# Altium footprint library General_Lib.PcbLib: 729 footprints (part 3 of 46)
Each footprint in its own frame and in the unit in brackets; x right, y up, seen from the top. Pads: shape width x height; smd on the part's side, far side on the other; paste and mask are expansions set on the pad; w line width, h text height; cw(c..) or ccw(c..) is an arc to the next point about the centre after c.
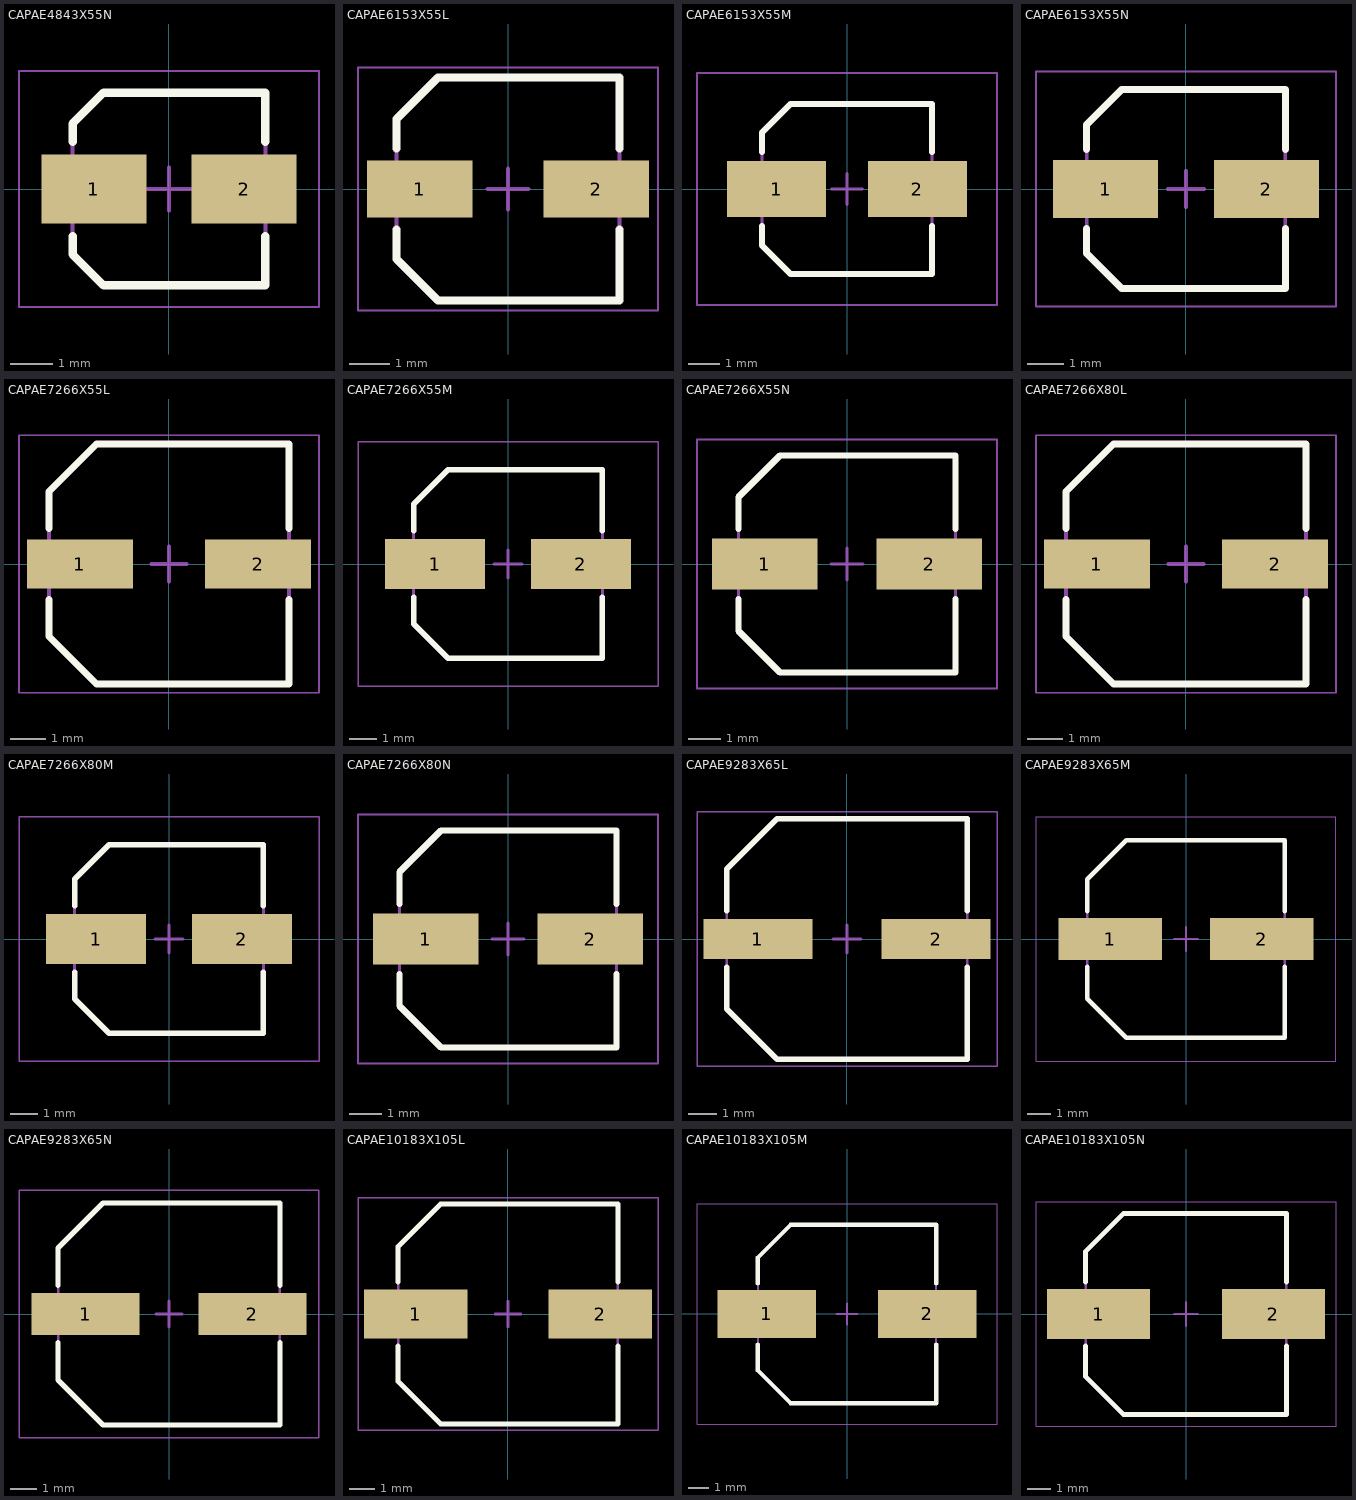
[diagram p2: the footprints below, top view; thin cyan lines are the x and y axes]

## CAPAE4843X55N [mm] "Aluminum Electrolytic Capacitor, Body 4,30x4,30x5,50mm, IPC Medium Density"
height 5.5
pads (2):
  rect 2.45x1.6 smd: 1(-1.75,0) 2(1.75,0)
Top Overlay:
  lines w0.2: -2.25,-1.1 -2.25,-1.525 -1.525,-2.25 2.25,-2.25 2.25,-1.1 ; -2.25,1.1 -2.25,1.525 -1.525,2.25 2.25,2.25 2.25,1.1
Mechanical 13:
  lines w0.1: -2.25,-1.525 -2.25,1.525 -1.525,2.25 2.25,2.25 2.25,-2.25 -1.525,-2.25 -2.25,-1.525
Mechanical 15:
  lines w0.05: -3.5,-2.75 3.5,-2.75 3.5,2.75 -3.5,2.75 -3.5,-2.75
  lines w0.1: -0.5,0 0.5,0 ; 0,-0.5 0,0.5
3D body "CAPAE4843X55N.step": height 5.5, standoff 0, extent -2.375,-2.25 2.375,2.25

## CAPAE6153X55L [mm] "Aluminum Electrolytic Capacitor, Body 5,30x5,30x5,50mm, IPC High Density"
height 5.5
pads (2):
  rect 2.6x1.4 smd: 1(-2.175,0) 2(2.175,0)
Top Overlay:
  lines w0.2: -2.75,-1 -2.75,-1.725 -1.725,-2.75 2.75,-2.75 2.75,-1 ; -2.75,1 -2.75,1.725 -1.725,2.75 2.75,2.75 2.75,1
Mechanical 13:
  lines w0.1: -2.75,-1.725 -2.75,1.725 -1.725,2.75 2.75,2.75 2.75,-2.75 -1.725,-2.75 -2.75,-1.725
Mechanical 15:
  lines w0.05: -3.7,-3 3.7,-3 3.7,3 -3.7,3 -3.7,-3
  lines w0.1: -0.5,0 0.5,0 ; 0,-0.5 0,0.5
3D body "CAPAE6153X55L.step": height 5.5, standoff 0, extent -3.05,-2.75 3.05,2.75

## CAPAE6153X55M [mm] "Aluminum Electrolytic Capacitor, Body 5,30x5,30x5,50mm, IPC Low Density"
height 5.5
pads (2):
  rect 3.2x1.8 smd: 1(-2.275,0) 2(2.275,0)
Top Overlay:
  lines w0.2: -2.75,-1.2 -2.75,-1.825 -1.825,-2.75 2.75,-2.75 2.75,-1.2 ; -2.75,1.2 -2.75,1.825 -1.825,2.75 2.75,2.75 2.75,1.2
Mechanical 13:
  lines w0.1: -2.75,-1.825 -1.825,-2.75 2.75,-2.75 2.75,2.75 -1.825,2.75 -2.75,1.825 -2.75,-1.825
Mechanical 15:
  lines w0.05: -4.85,-3.75 -4.85,3.75 4.85,3.75 4.85,-3.75 -4.85,-3.75
  lines w0.1: -0.5,0 0.5,0 ; 0,-0.5 0,0.5
3D body "CAPAE6153X55M.step": height 5.5, standoff 0, extent -3.05,-2.75 3.05,2.75

## CAPAE6153X55N [mm] "Aluminum Electrolytic Capacitor, Body 5,30x5,30x5,50mm, IPC Medium Density"
height 5.5
pads (2):
  rect 2.9x1.6 smd: 1(-2.225,0) 2(2.225,0)
Top Overlay:
  lines w0.2: -2.75,-1.1 -2.75,-1.775 -1.775,-2.75 2.75,-2.75 2.75,-1.1 ; -2.75,1.1 -2.75,1.775 -1.775,2.75 2.75,2.75 2.75,1.1
Mechanical 13:
  lines w0.1: -2.75,-1.775 -1.775,-2.75 2.75,-2.75 2.75,2.75 -1.775,2.75 -2.75,1.775 -2.75,-1.775
Mechanical 15:
  lines w0.05: -4.15,-3.25 -4.15,3.25 4.15,3.25 4.15,-3.25 -4.15,-3.25
  lines w0.1: -0.5,0 0.5,0 ; 0,-0.5 0,0.5
3D body "CAPAE6153X55N.step": height 5.5, standoff 0, extent -3.05,-2.75 3.05,2.75

## CAPAE7266X55L [mm] "Aluminum Electrolytic Capacitor, Body 6,60x6,60x5,50mm, IPC High Density"
height 5.5
pads (2):
  rect 3x1.4 smd: 1(-2.525,0) 2(2.525,0)
Top Overlay:
  lines w0.2: -3.4,-1 -3.4,-2.05 -2.05,-3.4 3.4,-3.4 3.4,-1 ; -3.4,1 -3.4,2.05 -2.05,3.4 3.4,3.4 3.4,1
Mechanical 13:
  lines w0.1: -3.4,-2.05 -2.05,-3.4 3.4,-3.4 3.4,3.4 -2.05,3.4 -3.4,2.05 -3.4,-2.05
Mechanical 15:
  lines w0.05: -4.25,-3.65 -4.25,3.65 4.25,3.65 4.25,-3.65 -4.25,-3.65
  lines w0.1: -0.5,0 0.5,0 ; 0,-0.5 0,0.5
3D body "CAPAE7266X55L.step": height 5.5, standoff -0.8, extent -3.6,-3.4 3.6,3.4

## CAPAE7266X55M [mm] "Aluminum Electrolytic Capacitor, Body 6,60x6,60x5,50mm, IPC Low Density"
height 5.5
pads (2):
  rect 3.6x1.8 smd: 1(-2.625,0) 2(2.625,0)
Top Overlay:
  lines w0.2: -3.4,-1.2 -3.4,-2.15 -2.15,-3.4 3.4,-3.4 3.4,-1.2 ; -3.4,1.2 -3.4,2.15 -2.15,3.4 3.4,3.4 3.4,1.2
Mechanical 13:
  lines w0.1: -3.4,-2.15 -2.15,-3.4 3.4,-3.4 3.4,3.4 -2.15,3.4 -3.4,2.15 -3.4,-2.15
Mechanical 15:
  lines w0.05: -5.4,-4.4 -5.4,4.4 5.4,4.4 5.4,-4.4 -5.4,-4.4
  lines w0.1: -0.5,0 0.5,0 ; 0,-0.5 0,0.5
3D body "CAPAE7266X55M.step": height 5.5, standoff -0.8, extent -3.6,-3.4 3.6,3.4

## CAPAE7266X55N [mm] "Aluminum Electrolytic Capacitor, Body 6,60x6,60x5,50mm, IPC Medium Density"
height 5.5
pads (2):
  rect 3.3x1.6 smd: 1(-2.575,0) 2(2.575,0)
Top Overlay:
  lines w0.2: -3.4,-1.1 -3.4,-2.1 -2.1,-3.4 3.4,-3.4 3.4,-1.1 ; -3.4,1.1 -3.4,2.1 -2.1,3.4 3.4,3.4 3.4,1.1
Mechanical 13:
  lines w0.1: -3.4,-2.1 -3.4,2.1 -2.1,3.4 3.4,3.4 3.4,-3.4 -2.1,-3.4 -3.4,-2.1
Mechanical 15:
  lines w0.05: -4.7,-3.9 4.7,-3.9 4.7,3.9 -4.7,3.9 -4.7,-3.9
  lines w0.1: -0.5,0 0.5,0 ; 0,-0.5 0,0.5
3D body "CAPAE7266X55N.step": height 5.5, standoff -0.8, extent -3.6,-3.4 3.6,3.4

## CAPAE7266X80L [mm] "Aluminum Electrolytic Capacitor, Body 6,60x6,60x8,00mm, IPC High Density"
height 8
pads (2):
  rect 3x1.4 smd: 1(-2.525,0) 2(2.525,0)
Top Overlay:
  lines w0.2: -3.4,-1 -3.4,-2.05 -2.05,-3.4 3.4,-3.4 3.4,-1 ; -3.4,1 -3.4,2.05 -2.05,3.4 3.4,3.4 3.4,1
Mechanical 13:
  lines w0.1: -3.4,-2.05 -3.4,2.05 -2.05,3.4 3.4,3.4 3.4,-3.4 -2.05,-3.4 -3.4,-2.05
Mechanical 15:
  lines w0.05: -4.25,-3.65 4.25,-3.65 4.25,3.65 -4.25,3.65 -4.25,-3.65
  lines w0.1: -0.5,0 0.5,0 ; 0,-0.5 0,0.5
3D body "CAPAE7266X80L.step": height 8, standoff 0, extent -3.6,-3.4 3.6,3.4

## CAPAE7266X80M [mm] "Aluminum Electrolytic Capacitor, Body 6,60x6,60x8,00mm, IPC Low Density"
height 8
pads (2):
  rect 3.6x1.8 smd: 1(-2.625,0) 2(2.625,0)
Top Overlay:
  lines w0.2: -3.4,-1.2 -3.4,-2.15 -2.15,-3.4 3.4,-3.4 3.4,-1.2 ; -3.4,1.2 -3.4,2.15 -2.15,3.4 3.4,3.4 3.4,1.2
Mechanical 13:
  lines w0.1: -3.4,-2.15 -3.4,2.15 -2.15,3.4 3.4,3.4 3.4,-3.4 -2.15,-3.4 -3.4,-2.15
Mechanical 15:
  lines w0.05: -5.4,-4.4 5.4,-4.4 5.4,4.4 -5.4,4.4 -5.4,-4.4
  lines w0.1: -0.5,0 0.5,0 ; 0,-0.5 0,0.5
3D body "CAPAE7266X80M.step": height 8, standoff 0, extent -3.6,-3.4 3.6,3.4

## CAPAE7266X80N [mm] "Aluminum Electrolytic Capacitor, Body 6,60x6,60x8,00mm, IPC Medium Density"
height 8
pads (2):
  rect 3.3x1.6 smd: 1(-2.575,0) 2(2.575,0)
Top Overlay:
  lines w0.2: -3.4,-1.1 -3.4,-2.1 -2.1,-3.4 3.4,-3.4 3.4,-1.1 ; -3.4,1.1 -3.4,2.1 -2.1,3.4 3.4,3.4 3.4,1.1
Mechanical 13:
  lines w0.1: -3.4,-2.1 -3.4,2.1 -2.1,3.4 3.4,3.4 3.4,-3.4 -2.1,-3.4 -3.4,-2.1
Mechanical 15:
  lines w0.05: -4.7,-3.9 4.7,-3.9 4.7,3.9 -4.7,3.9 -4.7,-3.9
  lines w0.1: -0.5,0 0.5,0 ; 0,-0.5 0,0.5
3D body "CAPAE7266X80N.step": height 8, standoff 0, extent -3.6,-3.4 3.6,3.4

## CAPAE9283X65L [mm] "Aluminum Electrolytic Capacitor, Body 8,30x8,30x6,50mm, IPC High Density"
height 6.5
pads (2):
  rect 3.85x1.4 smd: 1(-3.15,0) 2(3.15,0)
Top Overlay:
  lines w0.2: -4.25,-1 -4.25,-2.475 -2.475,-4.25 4.25,-4.25 4.25,-1 ; -4.25,1 -4.25,2.475 -2.475,4.25 4.25,4.25 4.25,1
Mechanical 13:
  lines w0.1: -4.25,-2.475 -4.25,2.475 -2.475,4.25 4.25,4.25 4.25,-4.25 -2.475,-4.25 -4.25,-2.475
Mechanical 15:
  lines w0.05: -5.3,-4.5 5.3,-4.5 5.3,4.5 -5.3,4.5 -5.3,-4.5
  lines w0.1: -0.5,0 0.5,0 ; 0,-0.5 0,0.5
3D body "CAPAE9283X65L.step": height 6.5, standoff -1.5, extent -4.625,-4.25 4.625,4.25

## CAPAE9283X65M [mm] "Aluminum Electrolytic Capacitor, Body 8,30x8,30x6,50mm, IPC Low Density"
height 6.5
pads (2):
  rect 4.45x1.8 smd: 1(-3.25,0) 2(3.25,0)
Top Overlay:
  lines w0.2: -4.25,-1.2 -4.25,-2.575 -2.575,-4.25 4.25,-4.25 4.25,-1.2 ; -4.25,1.2 -4.25,2.575 -2.575,4.25 4.25,4.25 4.25,1.2
Mechanical 13:
  lines w0.1: -4.25,-2.575 -4.25,2.575 -2.575,4.25 4.25,4.25 4.25,-4.25 -2.575,-4.25 -4.25,-2.575
Mechanical 15:
  lines w0.05: -6.45,-5.25 6.45,-5.25 6.45,5.25 -6.45,5.25 -6.45,-5.25
  lines w0.1: -0.5,0 0.5,0 ; 0,-0.5 0,0.5
3D body "CAPAE9283X65M.step": height 6.5, standoff -1.5, extent -4.625,-4.25 4.625,4.25

## CAPAE9283X65N [mm] "Aluminum Electrolytic Capacitor, Body 8,30x8,30x6,50mm, IPC Medium Density"
height 6.5
pads (2):
  rect 4.15x1.6 smd: 1(-3.2,0) 2(3.2,0)
Top Overlay:
  lines w0.2: -4.25,-1.1 -4.25,-2.525 -2.525,-4.25 4.25,-4.25 4.25,-1.1 ; -4.25,1.1 -4.25,2.525 -2.525,4.25 4.25,4.25 4.25,1.1
Mechanical 13:
  lines w0.1: -4.25,-2.525 -4.25,2.525 -2.525,4.25 4.25,4.25 4.25,-4.25 -2.525,-4.25 -4.25,-2.525
Mechanical 15:
  lines w0.05: -5.75,-4.75 5.75,-4.75 5.75,4.75 -5.75,4.75 -5.75,-4.75
  lines w0.1: -0.5,0 0.5,0 ; 0,-0.5 0,0.5
3D body "CAPAE9283X65N.step": height 6.5, standoff -1.5, extent -4.625,-4.25 4.625,4.25

## CAPAE10183X105L [mm] "Aluminum Electrolytic Capacitor, Body 8,30x8,30x10,50mm, IPC High Density"
height 10.5
pads (2):
  rect 4x1.9 smd: 1(-3.575,0) 2(3.575,0)
Top Overlay:
  lines w0.2: -4.25,-1.25 -4.25,-2.6 -2.6,-4.25 4.25,-4.25 4.25,-1.25 ; -4.25,1.25 -4.25,2.6 -2.6,4.25 4.25,4.25 4.25,1.25
Mechanical 13:
  lines w0.1: -4.25,-2.6 -4.25,2.6 -2.6,4.25 4.25,4.25 4.25,-4.25 -2.6,-4.25 -4.25,-2.6
Mechanical 15:
  lines w0.05: -5.8,-4.5 5.8,-4.5 5.8,4.5 -5.8,4.5 -5.8,-4.5
  lines w0.1: -0.5,0 0.5,0 ; 0,-0.5 0,0.5
3D body "CAPAE10183X105L.step": height 10.5, standoff 0, extent -5.05,-4.25 5.05,4.25

## CAPAE10183X105M [mm] "Aluminum Electrolytic Capacitor, Body 8,30x8,30x10,50mm, IPC Low Density"
height 10.5
pads (2):
  rect 4.7x2.3 smd: 1(-3.825,0) 2(3.825,0)
Top Overlay:
  lines w0.2: -4.25,-1.45 -4.25,-2.7 -2.7,-4.25 4.25,-4.25 4.25,-1.45 ; -4.25,1.45 -4.25,2.7 -2.7,4.25 4.25,4.25 4.25,1.45
Mechanical 13:
  lines w0.1: -4.25,-2.7 -4.25,2.7 -2.7,4.25 4.25,4.25 4.25,-4.25 -2.7,-4.25 -4.25,-2.7
Mechanical 15:
  lines w0.05: -7.15,-5.25 7.15,-5.25 7.15,5.25 -7.15,5.25 -7.15,-5.25
  lines w0.1: -0.5,0 0.5,0 ; 0,-0.5 0,0.5
3D body "CAPAE10183X105M.step": height 10.5, standoff 0, extent -5.05,-4.25 5.05,4.25

## CAPAE10183X105N [mm] "Aluminum Electrolytic Capacitor, Body 8,30x8,30x10,50mm, IPC Medium Density"
height 10.5
pads (2):
  rect 4.35x2.1 smd: 1(-3.7,0) 2(3.7,0)
Top Overlay:
  lines w0.2: -4.25,-1.35 -4.25,-2.65 -2.65,-4.25 4.25,-4.25 4.25,-1.35 ; -4.25,1.35 -4.25,2.65 -2.65,4.25 4.25,4.25 4.25,1.35
Mechanical 13:
  lines w0.1: -4.25,-2.65 -4.25,2.65 -2.65,4.25 4.25,4.25 4.25,-4.25 -2.65,-4.25 -4.25,-2.65
Mechanical 15:
  lines w0.05: -6.35,-4.75 6.35,-4.75 6.35,4.75 -6.35,4.75 -6.35,-4.75
  lines w0.1: -0.5,0 0.5,0 ; 0,-0.5 0,0.5
3D body "CAPAE10183X105N.step": height 10.5, standoff 0, extent -5.05,-4.25 5.05,4.25